# Altium integrated library Connectors - Phoenix.IntLib: 23 symbols
Pins are listed as number, name and electrical type; pins without a type are passive.

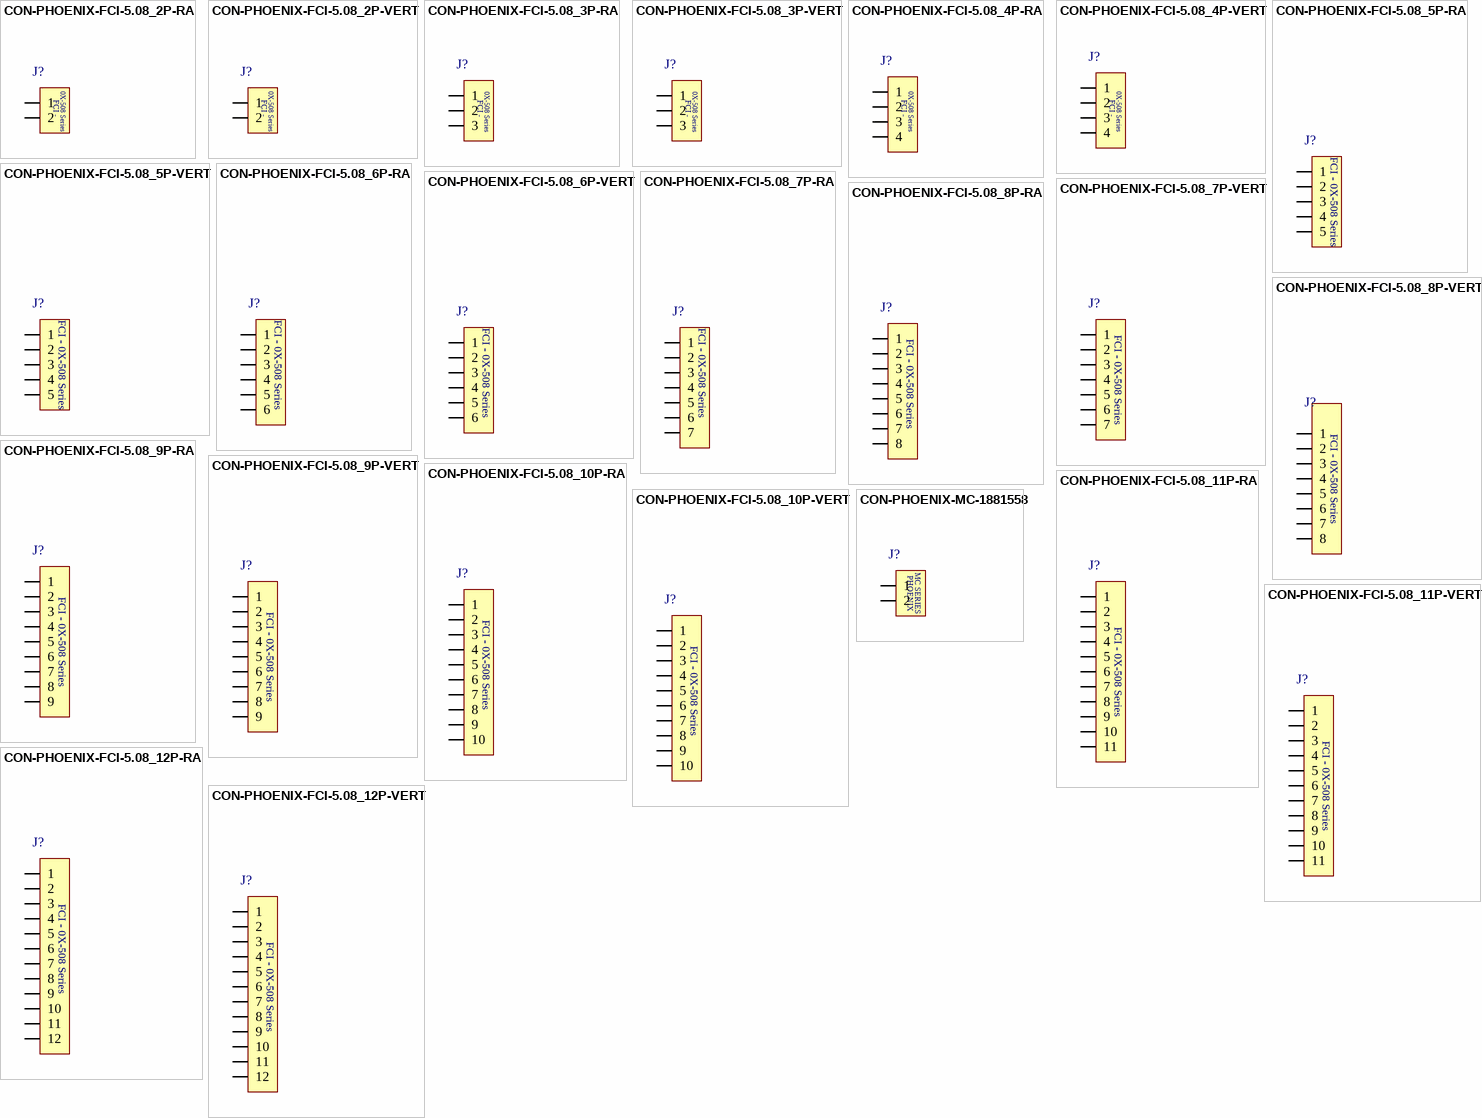
[diagram p0: symbols CON-PHOENIX-FCI-5.08_2P-RA to CON-PHOENIX-MC-1881558]

## CON-PHOENIX-FCI-5.08_2P-RA
designator J?, comment 20020110-H021A01LF  (value not drawn)
Terminal Block Header, 2 pin, 5.08mm pitch, Right Angle, Through Hole, Shrouded; Manufacturer: FCI Connect; Mates with (Wire housing): 20020006-H021B01LF; Pitch: 5.08mm (200mil); Rows: 1; ComponentLink1Description: Datasheet; ComponentLink1URL: \\canopus\EDA\Datasheets\Interconnects\PHOENIX\fci-terminal_blocks_catalog.pdf; Mates with (PCB): N/A; Mounting Type: Through Hole; PackageDescription: FCI 0X-508 Series Header, 5.08mm Pitch, 2 pin, Through hole, Vertical; Package Reference: PHOENIX-MSTBV-2-5.08MM; Pins: 2; Part Number: 20020110-H021A01LF; Supplier 1: Digi-Key; Supplier Part Number 1: 609-3907-ND; Supplier 2: Mouser; Supplier Part Number 2: 649-220110-H021A01LF; Supplier 3: Newark; Supplier Part Number 3: 59R8916
footprint PHOENIX-MSTBA-2-5.08MM (FCI 0X-508 Series Header, 5.08mm Pitch, 2 pin, Through hole, Right Angle)
3D model FCI-20020110-h02-5_08mm (PCB3D Model)
pins: 1, 2
text: 0X-508 Series; FCI -

## CON-PHOENIX-FCI-5.08_2P-VERT
designator J?, comment 20020107-H021A01LF  (value not drawn)
Terminal Block Header, 2 pin, 5.08mm pitch, Vertical, Through Hole, Shrouded; Manufacturer: FCI Connect; Mates with (Wire housing): 20020006-H021B01LF; Pitch: 5.08mm (200mil); Rows: 1; ComponentLink1Description: Datasheet; ComponentLink1URL: \\canopus\EDA\Datasheets\Interconnects\PHOENIX\fci-terminal_blocks_catalog.pdf; Mates with (PCB): N/A; Mounting Type: Through Hole; PackageDescription: FCI 0X-508 Series Header, 5.08mm Pitch, 2 pin, Through hole, Vertical; Package Reference: PHOENIX-MSTBV-2-5.08MM; Pins: 2; Part Number: 20020107-H021A01LF; Supplier 1: Digi-Key; Supplier Part Number 1: 609-3896-ND; Supplier 2: Mouser; Supplier Part Number 2: 649-220107-H021A01LF; Supplier 3: Newark; Supplier Part Number 3: 59R8880
3D model FCI-20020107-h02-5_08mm (PCB3D Model)
footprint PHOENIX-MSTBV-2-5.08MM (FCI 0X-508 Series Header, 5.08mm Pitch, 2 pin, Through hole, Vertical)
pins: 1, 2
text: 0X-508 Series; FCI -

## CON-PHOENIX-FCI-5.08_3P-RA
designator J?, comment 20020110-H031A01LF  (value not drawn)
Terminal Block Header, 3 pin, 5.08mm pitch, Right Angle, Through Hole, Shrouded; Manufacturer: FCI Connect; Mates with (Wire housing): 20020006-H031B01LF; Pitch: 5.08mm (200mil); Rows: 1; ComponentLink1Description: Datasheet; ComponentLink1URL: \\canopus\EDA\Datasheets\Interconnects\PHOENIX\fci-terminal_blocks_catalog.pdf; Mates with (PCB): N/A; Mounting Type: Through Hole; PackageDescription: FCI 0X-508 Series Header, 5.08mm Pitch, 3 pin, Through hole, Vertical; Package Reference: PHOENIX-MSTBV-3-5.08MM; Pins: 3; Part Number: 20020110-H031A01LF; Supplier 1: Newark; Supplier Part Number 1: 59R8917; Supplier 2: Digi-Key; Supplier Part Number 2: 609-3908-ND; Supplier 3: Mouser; Supplier Part Number 3: 649-220110-H031A01LF
3D model FCI-20020110-h03-5_08mm (PCB3D Model)
footprint PHOENIX-MSTBA-3-5.08MM (FCI 0X-508 Series Header, 5.08mm Pitch, 3 pin, Through hole, Right Angle)
pins: 1, 2, 3
text: 0X-508 Series; FCI -

## CON-PHOENIX-FCI-5.08_3P-VERT
designator J?, comment 20020107-H031A01LF  (value not drawn)
Terminal Block Header, 3 pin, 5.08mm pitch, Vertical, Through Hole, Shrouded; Manufacturer: FCI Connect; Mates with (Wire housing): 20020006-H031B01LF; Pitch: 5.08mm (200mil); Rows: 1; ComponentLink1Description: Datasheet; ComponentLink1URL: \\canopus\EDA\Datasheets\Interconnects\PHOENIX\fci-terminal_blocks_catalog.pdf; Mates with (PCB): N/A; Mounting Type: Through Hole; PackageDescription: FCI 0X-508 Series Header, 5.08mm Pitch, 3 pin, Through hole, Vertical; Package Reference: PHOENIX-MSTBV-3-5.08MM; Pins: 3; Part Number: 20020107-H031A01LF; Supplier 1: Mouser; Supplier Part Number 1: 649-220107-H031A01LF; Supplier 2: Newark; Supplier Part Number 2: 59R8881; Supplier 3: Digi-Key; Supplier Part Number 3: 609-3897-ND
footprint PHOENIX-MSTBV-3-5.08MM (FCI 0X-508 Series Header, 5.08mm Pitch, 3 pin, Through hole, Vertical)
3D model FCI-20020107-h03-5_08mm (PCB3D Model)
pins: 1, 2, 3
text: 0X-508 Series; FCI -

## CON-PHOENIX-FCI-5.08_4P-RA
designator J?, comment 20020110-H041A01LF  (value not drawn)
Terminal Block Header, 4 pin, 5.08mm pitch, Right Angle, Through Hole, Shrouded; Manufacturer: FCI Connect; Mates with (Wire housing): 20020006-H041B01LF; Pitch: 5.08mm (200mil); Rows: 1; ComponentLink1Description: Datasheet; ComponentLink1URL: \\canopus\EDA\Datasheets\Interconnects\PHOENIX\fci-terminal_blocks_catalog.pdf; Mates with (PCB): N/A; Mounting Type: Through Hole; PackageDescription: FCI 0X-508 Series Header, 5.08mm Pitch, 2 pin, Through hole, Vertical; Package Reference: PHOENIX-MSTBV-4-5.08MM; Pins: 4; Part Number: 20020110-H041A01LF; Supplier 1: Mouser; Supplier Part Number 1: 649-220110-H041A01LF; Supplier 2: Newark; Supplier Part Number 2: 59R8918; Supplier 3: Digi-Key; Supplier Part Number 3: 609-3909-ND
3D model FCI-20020110-h04-5_08mm (PCB3D Model)
footprint PHOENIX-MSTBA-4-5.08MM (FCI 0X-508 Series Header, 5.08mm Pitch, 4 pin, Through hole, Right Angle)
pins: 1, 2, 3, 4
text: 0X-508 Series; FCI -

## CON-PHOENIX-FCI-5.08_4P-VERT
designator J?, comment 20020107-H041A01LF  (value not drawn)
Terminal Block Header, 4 pin, 5.08mm pitch, Vertical, Through Hole, Shrouded; Manufacturer: FCI Connect; Mates with (Wire housing): 20020006-H041B01LF; Pitch: 5.08mm (200mil); Rows: 1; ComponentLink1Description: Datasheet; ComponentLink1URL: \\canopus\EDA\Datasheets\Interconnects\PHOENIX\fci-terminal_blocks_catalog.pdf; Mates with (PCB): N/A; Mounting Type: Through Hole; PackageDescription: FCI 0X-508 Series Header, 5.08mm Pitch, 2 pin, Through hole, Vertical; Package Reference: PHOENIX-MSTBV-4-5.08MM; Pins: 4; Part Number: 20020107-H041A01LF; Supplier 1: Newark; Supplier Part Number 1: 59R8882; Supplier 2: Digi-Key; Supplier Part Number 2: 609-3898-ND; Supplier 3: Mouser; Supplier Part Number 3: 649-220107-H041A01LF
footprint PHOENIX-MSTBV-4-5.08MM (FCI 0X-508 Series Header, 5.08mm Pitch, 4 pin, Through hole, Vertical)
3D model FCI-20020107-h04-5_08mm (PCB3D Model)
pins: 1, 2, 3, 4
text: 0X-508 Series; FCI -

## CON-PHOENIX-FCI-5.08_5P-RA
designator J?, comment 20020110-H051A01LF  (value not drawn)
Terminal Block Header, 5 pin, 5.08mm pitch, Right Angle, Through Hole, Shrouded; Manufacturer: FCI Connect; Mates with (Wire housing): 20020006-H051B01LF; Pitch: 5.08mm (200mil); Rows: 1; ComponentLink1Description: Datasheet; ComponentLink1URL: \\canopus\EDA\Datasheets\Interconnects\PHOENIX\fci-terminal_blocks_catalog.pdf; Mates with (PCB): N/A; Mounting Type: Through Hole; PackageDescription: FCI 0X-508 Series Header, 5.08mm Pitch, 5 pin, Through hole, Vertical; Package Reference: PHOENIX-MSTBV-5-5.08MM; Pins: 5; Part Number: 20020110-H051A01LF; Supplier 1: Newark; Supplier Part Number 1: 59R8919; Supplier 2: Mouser; Supplier Part Number 2: 649-220110-H051A01LF; Supplier 3: Digi-Key; Supplier Part Number 3: 609-3910-ND
3D model FCI-20020110-h05-5_08mm (PCB3D Model)
footprint PHOENIX-MSTBA-5-5.08MM (FCI 0X-508 Series Header, 5.08mm Pitch, 5 pin, Through hole, Right Angle)
pins: 1, 2, 3, 4, 5
text: FCI - 0X-508 Series

## CON-PHOENIX-FCI-5.08_5P-VERT
designator J?, comment 20020107-H051A01LF  (value not drawn)
Terminal Block Header, 5 pin, 5.08mm pitch, Vertical, Through Hole, Shrouded; Manufacturer: FCI Connect; Mates with (Wire housing): 20020006-H051B01LF; Pitch: 5.08mm (200mil); Rows: 1; ComponentLink1Description: Datasheet; ComponentLink1URL: \\canopus\EDA\Datasheets\Interconnects\PHOENIX\fci-terminal_blocks_catalog.pdf; Mates with (PCB): N/A; Mounting Type: Through Hole; PackageDescription: FCI 0X-508 Series Header, 5.08mm Pitch, 5 pin, Through hole, Vertical; Package Reference: PHOENIX-MSTBV-5-5.08MM; Pins: 5; Part Number: 20020107-H051A01LF; Supplier 1: Digi-Key; Supplier Part Number 1: 609-3899-ND; Supplier 2: Mouser; Supplier Part Number 2: 649-220107-H051A01LF; Supplier 3: Newark; Supplier Part Number 3: 59R8883
footprint PHOENIX-MSTBV-5-5.08MM (FCI 0X-508 Series Header, 5.08mm Pitch, 5 pin, Through hole, Vertical)
3D model FCI-20020107-h05-5_08mm (PCB3D Model)
pins: 1, 2, 3, 4, 5
text: FCI - 0X-508 Series

## CON-PHOENIX-FCI-5.08_6P-RA
designator J?, comment 20020110-H061A01LF  (value not drawn)
Terminal Block Header, 6 pin, 5.08mm pitch, Right Angle, Through Hole, Shrouded; Manufacturer: FCI Connect; Mates with (Wire housing): 20020006-H061B01LF; Pitch: 5.08mm (200mil); Rows: 1; ComponentLink1Description: Datasheet; ComponentLink1URL: \\canopus\EDA\Datasheets\Interconnects\PHOENIX\fci-terminal_blocks_catalog.pdf; Mates with (PCB): N/A; Mounting Type: Through Hole; PackageDescription: FCI 0X-508 Series Header, 5.08mm Pitch, 6 pin, Through hole, Vertical; Package Reference: PHOENIX-MSTBV-6-5.08MM; Pins: 6; Part Number: 20020110-H061A01LF; Supplier 1: Newark; Supplier Part Number 1: 59R8920; Supplier 2: Mouser; Supplier Part Number 2: 649-220110-H061A01LF; Supplier 3: Digi-Key; Supplier Part Number 3: 609-3911-ND
3D model FCI-20020110-h06-5_08mm (PCB3D Model)
footprint PHOENIX-MSTBA-6-5.08MM (FCI 0X-508 Series Header, 5.08mm Pitch, 6 pin, Through hole, Right Angle)
pins: 1, 2, 3, 4, 5, 6
text: FCI - 0X-508 Series

## CON-PHOENIX-FCI-5.08_6P-VERT
designator J?, comment 20020107-H061A01LF  (value not drawn)
Terminal Block Header, 6 pin, 5.08mm pitch, Vertical, Through Hole, Shrouded; Manufacturer: FCI Connect; Mates with (Wire housing): 20020006-H061B01LF; Pitch: 5.08mm (200mil); Rows: 1; ComponentLink1Description: Datasheet; ComponentLink1URL: \\canopus\EDA\Datasheets\Interconnects\PHOENIX\fci-terminal_blocks_catalog.pdf; Mates with (PCB): N/A; Mounting Type: Through Hole; PackageDescription: FCI 0X-508 Series Header, 5.08mm Pitch, 6 pin, Through hole, Vertical; Package Reference: PHOENIX-MSTBV-6-5.08MM; Pins: 6; Part Number: 20020107-H061A01LF; Supplier 1: Mouser; Supplier Part Number 1: 649-220107-H061A01LF; Supplier 2: Newark; Supplier Part Number 2: 59R8884; Supplier 3: Digi-Key; Supplier Part Number 3: 609-3900-ND
footprint PHOENIX-MSTBV-6-5.08MM (FCI 0X-508 Series Header, 5.08mm Pitch, 6 pin, Through hole, Vertical)
3D model FCI-20020107-h06-5_08mm (PCB3D Model)
pins: 1, 2, 3, 4, 5, 6
text: FCI - 0X-508 Series

## CON-PHOENIX-FCI-5.08_7P-RA
designator J?, comment 20020110-H071A01LF  (value not drawn)
Terminal Block Header, 7 pin, 5.08mm pitch, Right Angle, Through Hole, Shrouded; Manufacturer: FCI Connect; Mates with (Wire housing): 20020006-H071B01LF; Pitch: 5.08mm (200mil); Rows: 1; ComponentLink1Description: Datasheet; ComponentLink1URL: \\canopus\EDA\Datasheets\Interconnects\PHOENIX\fci-terminal_blocks_catalog.pdf; Mates with (PCB): N/A; Mounting Type: Through Hole; PackageDescription: FCI 0X-508 Series Header, 5.08mm Pitch, 7 pin, Through hole, Vertical; Package Reference: PHOENIX-MSTBV-7-5.08MM; Pins: 7; Part Number: 20020110-H071A01LF; Supplier 1: Newark; Supplier Part Number 1: 59R8921; Supplier 2: Mouser; Supplier Part Number 2: 649-220110-H071A01LF; Supplier 3: Digi-Key; Supplier Part Number 3: 609-3912-ND
3D model FCI-20020110-h07-5_08mm (PCB3D Model)
footprint PHOENIX-MSTBA-7-5.08MM (FCI 0X-508 Series Header, 5.08mm Pitch, 7 pin, Through hole, Right Angle)
pins: 1, 2, 3, 4, 5, 6, 7
text: FCI - 0X-508 Series

## CON-PHOENIX-FCI-5.08_7P-VERT
designator J?, comment 20020107-H071A01LF  (value not drawn)
Terminal Block Header, 7 pin, 5.08mm pitch, Vertical, Through Hole, Shrouded; Manufacturer: FCI Connect; Mates with (Wire housing): 20020006-H071B01LF; Pitch: 5.08mm (200mil); Rows: 1; ComponentLink1Description: Datasheet; ComponentLink1URL: \\canopus\EDA\Datasheets\Interconnects\PHOENIX\fci-terminal_blocks_catalog.pdf; Mates with (PCB): N/A; Mounting Type: Through Hole; PackageDescription: FCI 0X-508 Series Header, 5.08mm Pitch, 7 pin, Through hole, Vertical; Package Reference: PHOENIX-MSTBV-7-5.08MM; Pins: 7; Part Number: 20020107-H071A01LF; Supplier 1: Mouser; Supplier Part Number 1: 649-220107-H071A01LF; Supplier 2: Newark; Supplier Part Number 2: 59R8885; Supplier 3: Digi-Key; Supplier Part Number 3: 609-3901-ND
footprint PHOENIX-MSTBV-7-5.08MM (FCI 0X-508 Series Header, 5.08mm Pitch, 7 pin, Through hole, Vertical)
3D model FCI-20020107-h07-5_08mm (PCB3D Model)
pins: 1, 2, 3, 4, 5, 6, 7
text: FCI - 0X-508 Series

## CON-PHOENIX-FCI-5.08_8P-RA
designator J?, comment 20020110-H081A01LF  (value not drawn)
Terminal Block Header, 8 pin, 5.08mm pitch, Right Angle, Through Hole, Shrouded; Manufacturer: FCI Connect; Mates with (Wire housing): 20020006-H081B01LF; Pitch: 5.08mm (200mil); Rows: 1; ComponentLink1Description: Datasheet; ComponentLink1URL: \\canopus\EDA\Datasheets\Interconnects\PHOENIX\fci-terminal_blocks_catalog.pdf; Mates with (PCB): N/A; Mounting Type: Through Hole; PackageDescription: FCI 0X-508 Series Header, 5.08mm Pitch, 8 pin, Through hole, Vertical; Package Reference: PHOENIX-MSTBV-8-5.08MM; Pins: 8; Part Number: 20020110-H081A01LF; Supplier 1: Mouser; Supplier Part Number 1: 649-220110-H081A01LF; Supplier 2: Newark; Supplier Part Number 2: 59R8922; Supplier 3: Digi-Key; Supplier Part Number 3: 609-3913-ND
3D model FCI-20020110-h08-5_08mm (PCB3D Model)
footprint PHOENIX-MSTBA-8-5.08MM (FCI 0X-508 Series Header, 5.08mm Pitch, 8 pin, Through hole, Right Angle)
pins: 1, 2, 3, 4, 5, 6, 7, 8
text: FCI - 0X-508 Series

## CON-PHOENIX-FCI-5.08_8P-VERT
designator J?, comment 20020107-H081A01LF  (value not drawn)
Terminal Block Header, 8 pin, 5.08mm pitch, Vertical, Through Hole, Shrouded; Manufacturer: FCI Connect; Mates with (Wire housing): 20020006-H081B01LF; Pitch: 5.08mm (200mil); Rows: 1; ComponentLink1Description: Datasheet; ComponentLink1URL: \\canopus\EDA\Datasheets\Interconnects\PHOENIX\fci-terminal_blocks_catalog.pdf; Mates with (PCB): N/A; Mounting Type: Through Hole; PackageDescription: FCI 0X-508 Series Header, 5.08mm Pitch, 8 pin, Through hole, Vertical; Package Reference: PHOENIX-MSTBV-8-5.08MM; Pins: 8; Part Number: 20020107-H081A01LF; Supplier 1: Digi-Key; Supplier Part Number 1: 609-3902-ND; Supplier 2: Mouser; Supplier Part Number 2: 649-220107-H081A01LF; Supplier 3: Newark; Supplier Part Number 3: 59R8886
footprint PHOENIX-MSTBV-8-5.08MM (FCI 0X-508 Series Header, 5.08mm Pitch, 8 pin, Through hole, Vertical)
3D model FCI-20020107-h08-5_08mm (PCB3D Model)
pins: 1, 2, 3, 4, 5, 6, 7, 8
text: FCI - 0X-508 Series

## CON-PHOENIX-FCI-5.08_9P-RA
designator J?, comment 20020110-H091A01LF  (value not drawn)
Terminal Block Header, 9 pin, 5.08mm pitch, Right Angle, Through Hole, Shrouded; Manufacturer: FCI Connect; Mates with (Wire housing): 20020006-H091B01LF; Pitch: 5.08mm (200mil); Rows: 1; ComponentLink1Description: Datasheet; ComponentLink1URL: \\canopus\EDA\Datasheets\Interconnects\PHOENIX\fci-terminal_blocks_catalog.pdf; Mates with (PCB): N/A; Mounting Type: Through Hole; PackageDescription: FCI 0X-508 Series Header, 5.08mm Pitch, 9 pin, Through hole, Vertical; Package Reference: PHOENIX-MSTBV-9-5.08MM; Pins: 9; Part Number: 20020110-H091A01LF; Supplier 1: Digi-Key; Supplier Part Number 1: 609-3914-ND; Supplier 2: Mouser; Supplier Part Number 2: 649-220110-H091A01LF; Supplier 3: Newark; Supplier Part Number 3: 59R8923
3D model FCI-20020110-h09-5_08mm (PCB3D Model)
footprint PHOENIX-MSTBA-9-5.08MM (FCI 0X-508 Series Header, 5.08mm Pitch, 9 pin, Through hole, Right Angle)
pins: 1, 2, 3, 4, 5, 6, 7, 8, 9
text: FCI - 0X-508 Series

## CON-PHOENIX-FCI-5.08_9P-VERT
designator J?, comment 20020107-H091A01LF  (value not drawn)
Terminal Block Header, 9 pin, 5.08mm pitch, Vertical, Through Hole, Shrouded; Manufacturer: FCI Connect; Mates with (Wire housing): 20020006-H091B01LF; Pitch: 5.08mm (200mil); Rows: 1; ComponentLink1Description: Datasheet; ComponentLink1URL: \\canopus\EDA\Datasheets\Interconnects\PHOENIX\fci-terminal_blocks_catalog.pdf; Mates with (PCB): N/A; Mounting Type: Through Hole; PackageDescription: FCI 0X-508 Series Header, 5.08mm Pitch, 9 pin, Through hole, Vertical; Package Reference: PHOENIX-MSTBV-9-5.08MM; Pins: 9; Part Number: 20020107-H091A01LF; Supplier 1: Digi-Key; Supplier Part Number 1: 609-3903-ND; Supplier 2: Mouser; Supplier Part Number 2: 649-220107-H091A01LF; Supplier 3: Newark; Supplier Part Number 3: 59R8887
footprint PHOENIX-MSTBV-9-5.08MM (FCI 0X-508 Series Header, 5.08mm Pitch, 9 pin, Through hole, Vertical)
3D model FCI-20020107-h09-5_08mm (PCB3D Model)
pins: 1, 2, 3, 4, 5, 6, 7, 8, 9
text: FCI - 0X-508 Series

## CON-PHOENIX-FCI-5.08_10P-RA
designator J?, comment 20020110-H101A01LF  (value not drawn)
Terminal Block Header, 10 pin, 5.08mm pitch, Right Angle, Through Hole, Shrouded; Manufacturer: FCI Connect; Mates with (Wire housing): 20020006-H101B01LF; Pitch: 5.08mm (200mil); Rows: 1; ComponentLink1Description: Datasheet; ComponentLink1URL: \\canopus\EDA\Datasheets\Interconnects\PHOENIX\fci-terminal_blocks_catalog.pdf; Mates with (PCB): N/A; Mounting Type: Through Hole; PackageDescription: FCI 0X-508 Series Header, 5.08mm Pitch, 10 pin, Through hole, Right Angle; Package Reference: PHOENIX-MSTBV-10-5.08MM; Pins: 10; Part Number: 20020110-H101A01LF; Supplier 1: Mouser; Supplier Part Number 1: 649-220110-H101A01LF; Supplier 2: Newark; Supplier Part Number 2: 59R8924; Supplier 3: Digi-Key; Supplier Part Number 3: 609-3915-ND
3D model FCI-20020110-h10-5_08mm (PCB3D Model)
footprint PHOENIX-MSTBA-10-5.08MM (FCI 0X-508 Series Header, 5.08mm Pitch, 10 pin, Through hole, Right Angle)
pins: 1, 2, 3, 4, 5, 6, 7, 8, 9, 10
text: FCI - 0X-508 Series

## CON-PHOENIX-FCI-5.08_10P-VERT
designator J?, comment 20020107-H101A01LF  (value not drawn)
Terminal Block Header, 10 pin, 5.08mm pitch, Vertical, Through Hole, Shrouded; Manufacturer: FCI Connect; Mates with (Wire housing): 20020006-H101B01LF; Pitch: 5.08mm (200mil); Rows: 1; ComponentLink1Description: Datasheet; ComponentLink1URL: \\canopus\EDA\Datasheets\Interconnects\PHOENIX\fci-terminal_blocks_catalog.pdf; Mates with (PCB): N/A; Mounting Type: Through Hole; PackageDescription: FCI 0X-508 Series Header, 5.08mm Pitch, 10 pin, Through hole, Vertical; Package Reference: PHOENIX-MSTBV-10-5.08MM; Pins: 10; Part Number: 20020107-H101A01LF; Supplier 1: Digi-Key; Supplier Part Number 1: 609-3904-ND; Supplier 2: Mouser; Supplier Part Number 2: 649-220107-H101A01LF; Supplier 3: Newark; Supplier Part Number 3: 59R8888
footprint PHOENIX-MSTBV-10-5.08MM (FCI 0X-508 Series Header, 5.08mm Pitch, 10 pin, Through hole, Vertical)
3D model FCI-20020107-h10-5_08mm (PCB3D Model)
pins: 1, 2, 3, 4, 5, 6, 7, 8, 9, 10
text: FCI - 0X-508 Series

## CON-PHOENIX-FCI-5.08_11P-RA
designator J?, comment 20020110-H111A01LF  (value not drawn)
Terminal Block Header, 11 pin, 5.08mm pitch, Right Angle, Through Hole, Shrouded; Manufacturer: FCI Connect; Mates with (Wire housing): 20020006-H111B01LF; Pitch: 5.08mm (200mil); Rows: 1; ComponentLink1Description: Datasheet; ComponentLink1URL: \\canopus\EDA\Datasheets\Interconnects\PHOENIX\fci-terminal_blocks_catalog.pdf; Mates with (PCB): N/A; Mounting Type: Through Hole; PackageDescription: FCI 0X-508 Series Header, 5.08mm Pitch, 11 pin, Through hole, Right Angle; Package Reference: PHOENIX-MSTBV-11-5.08MM; Pins: 11; Part Number: 20020110-H111A01LF; Supplier 1: Mouser; Supplier Part Number 1: 649-220110-H111A01LF; Supplier 2: Newark; Supplier Part Number 2: 14X6444; Supplier 3: Digi-Key; Supplier Part Number 3: 20020110-H111A01LF-ND
3D model FCI-20020110-h11-5_08mm (PCB3D Model)
footprint PHOENIX-MSTBA-11-5.08MM (FCI 0X-508 Series Header, 5.08mm Pitch, 11 pin, Through hole, Right Angle)
pins: 1, 2, 3, 4, 5, 6, 7, 8, 9, 10, 11
text: FCI - 0X-508 Series

## CON-PHOENIX-FCI-5.08_11P-VERT
designator J?, comment 20020107-H111A01LF  (value not drawn)
Terminal Block Header, 11 pin, 5.08mm pitch, Vertical, Through Hole, Shrouded; Manufacturer: FCI Connect; Mates with (Wire housing): 20020006-H111B01LF; Pitch: 5.08mm (200mil); Rows: 1; ComponentLink1Description: Datasheet; ComponentLink1URL: \\canopus\EDA\Datasheets\Interconnects\PHOENIX\fci-terminal_blocks_catalog.pdf; Mates with (PCB): N/A; Mounting Type: Through Hole; PackageDescription: FCI 0X-508 Series Header, 5.08mm Pitch, 11 pin, Through hole, Vertical; Package Reference: PHOENIX-MSTBV-11-5.08MM; Pins: 11; Part Number: 20020107-H111A01LF; Supplier 1: Newark; Supplier Part Number 1: 14X6330; Supplier 2: Digi-Key; Supplier Part Number 2: 20020107-H111A01LF-ND; Supplier 3: Mouser; Supplier Part Number 3: 649-220107-H111A01LF
footprint PHOENIX-MSTBV-11-5.08MM (FCI 0X-508 Series Header, 5.08mm Pitch, 11 pin, Through hole, Vertical)
3D model FCI-20020107-h11-5_08mm (PCB3D Model)
pins: 1, 2, 3, 4, 5, 6, 7, 8, 9, 10, 11
text: FCI - 0X-508 Series

## CON-PHOENIX-FCI-5.08_12P-RA
designator J?, comment 20020110-H121A01LF  (value not drawn)
Terminal Block Header, 12 pin, 5.08mm pitch, Right Angle, Through Hole, Shrouded; Manufacturer: FCI Connect; Mates with (Wire housing): 20020006-H1221B01LF; Pitch: 5.08mm (200mil); Rows: 1; ComponentLink1Description: Datasheet; ComponentLink1URL: \\canopus\EDA\Datasheets\Interconnects\PHOENIX\fci-terminal_blocks_catalog.pdf; Mates with (PCB): N/A; Mounting Type: Through Hole; PackageDescription: FCI 0X-508 Series Header, 5.08mm Pitch, 12 pin, Through hole, Right Angle; Package Reference: PHOENIX-MSTBV-12-5.08MM; Pins: 12; Part Number: 20020110-H121A01LF; Supplier 1: Newark; Supplier Part Number 1: 63R8121; Supplier 2: Mouser; Supplier Part Number 2: 649-220110-H121A01LF; Supplier 3: Digi-Key; Supplier Part Number 3: 609-3916-ND
3D model FCI-20020110-h12-5_08mm (PCB3D Model)
footprint PHOENIX-MSTBA-12-5.08MM (FCI 0X-508 Series Header, 5.08mm Pitch, 12 pin, Through hole, Right Angle)
pins: 1, 2, 3, 4, 5, 6, 7, 8, 9, 10, 11, 12
text: FCI - 0X-508 Series

## CON-PHOENIX-FCI-5.08_12P-VERT
designator J?, comment 20020107-H121A01LF  (value not drawn)
Terminal Block Header, 12 pin, 5.08mm pitch, Vertical, Through Hole, Shrouded; Manufacturer: FCI Connect; Mates with (Wire housing): 20020006-H1221B01LF; Pitch: 5.08mm (200mil); Rows: 1; ComponentLink1Description: Datasheet; ComponentLink1URL: \\canopus\EDA\Datasheets\Interconnects\PHOENIX\fci-terminal_blocks_catalog.pdf; Mates with (PCB): N/A; Mounting Type: Through Hole; PackageDescription: FCI 0X-508 Series Header, 5.08mm Pitch, 12 pin, Through hole, Vertical; Package Reference: PHOENIX-MSTBV-12-5.08MM; Pins: 12; Part Number: 20020107-H121A01LF; Supplier 1: Mouser; Supplier Part Number 1: 649-220107-H121A01LF; Supplier 2: Digi-Key; Supplier Part Number 2: 609-3905-ND
footprint PHOENIX-MSTBV-12-5.08MM (FCI 0X-508 Series Header, 5.08mm Pitch, 12 pin, Through hole, Vertical)
3D model FCI-20020107-h12-5_08mm (PCB3D Model)
pins: 1, 2, 3, 4, 5, 6, 7, 8, 9, 10, 11, 12
text: FCI - 0X-508 Series

## CON-PHOENIX-MC-1881558
designator J?, comment 1881558  (value not drawn)
Terminal Block Header, 2 pin, 2.5mm pitch, Vertical, Through Hole, Shrouded; Manufacturer: Phoenix Contact; Mates with (Wire housing): 1881325; Rows: 1; ComponentLink1Description: Datasheet; ComponentLink1URL: \\canopus\EDA\Datasheets\Interconnects\PHOENIX\COMBICON-2.5mm_DE.pdf; Mates with (PCB): N/A; Mounting Type: Through Hole; PackageDescription: MC Series Header, 2.5mm Pitch, 2 pin, Through hole, Vertical; Package Reference: PHOENIX-MC-V-2-2.5mm; Part Number: 1881558; Pins: 2; Pitch: 2.5mm; Supplier 1: Digi-Key; Supplier Part Number 1: 277-1452-ND; Supplier 2: Newark; Supplier Part Number 2: 15X1773; Supplier 3: Mouser; Supplier Part Number 3: 651-1881558
footprint PHOENIX-MC-V-2-2.5mm (MC Series Header, 2.5mm Pitch, 2 pin, Through hole, Vertical)
3D model Phoenix-MCV-2-2_5mm (PCB3D Model)
pins: 1, 2
text: MC SERIES; PHOENIX